# Altium footprint library MPBoard.PcbLib: 123 footprints (part 4 of 8)
Each footprint in its own frame and in the unit in brackets; x right, y up, seen from the top. Pads: shape width x height; smd on the part's side, far side on the other; paste and mask are expansions set on the pad; w line width, h text height; cw(c..) or ccw(c..) is an arc to the next point about the centre after c.
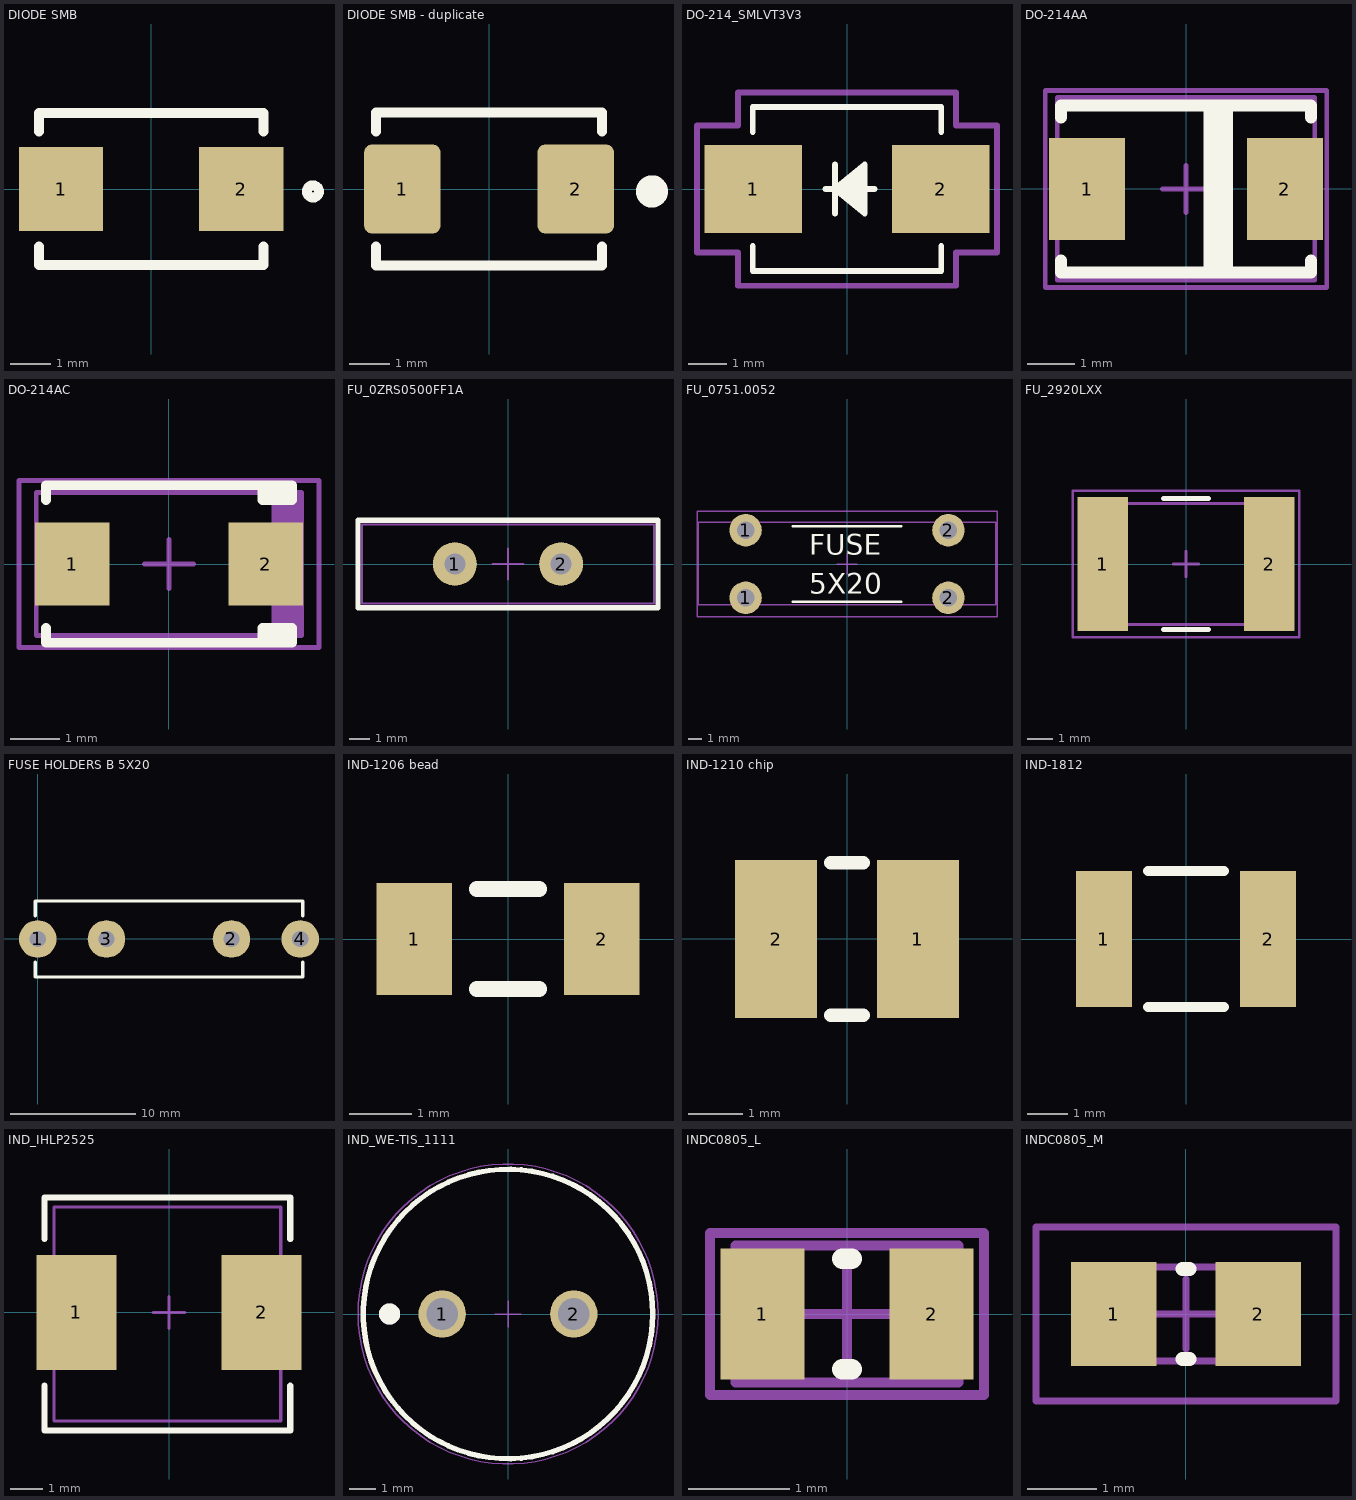
[diagram p3: the footprints below, top view; thin cyan lines are the x and y axes]

## DIODE SMB [mm]
pads (2):
  rect 2.1x2.1 smd: 1(-2.25,0) 2(2.25,0)
Top Overlay:
  circle w0.25: c4.04,-0.06 r0.15
  lines w0.25: -2.8,-1.43 -2.8,-1.9 2.8,-1.9 2.8,-1.43 ; -2.8,1.43 -2.8,1.9 2.8,1.9 2.8,1.43
3D body "diod_smb.stp": height 2.63, standoff -0.02, extent -2.794,-1.975 2.794,1.975

## DIODE SMB - duplicate [mm]
pads (2):
  rrect20% 1.9x2.2 smd: 1(-2.15,0) 2(2.15,0)
Top Overlay:
  circle w0.5: c4.04,-0.06 r0.15
  lines w0.25: -2.8,-1.43 -2.8,-1.9 2.8,-1.9 2.8,-1.43 ; -2.8,1.43 -2.8,1.9 2.8,1.9 2.8,1.43
3D body "diod_smb.stp": height 2.63, standoff -0.02, extent -2.794,-1.975 2.794,1.975

## DO-214_SMLVT3V3 [mil]
pads (2):
  rect 99x89 smd paste+0 mask+0: 1(-95,0) 2(95,0)
Top Overlay:
  lines w6: -95.5,-57.6 -95.5,-83 95.5,-83 95.5,-57.6 ; -95.5,57.6 -95.5,83 95.5,83 95.5,57.6 ; -22,0 28,0 ; -12,-25 -12,25 ; 18,-20 -12,0 ; 18,-15 -12,0 ; 18,-10 -12,0 ; 18,-5 -12,0 ; 18,5 -12,0 ; 18,10 -12,0 ; 18,15 -12,0 ; 18,20 -12,0 ; -12,0 18,-25 18,25 -12,0
Mechanical 13:
  lines w1: -22,0 28,0 ; -12,-25 -12,25 ; 18,-20 -12,0 ; 18,-15 -12,0 ; 18,-10 -12,0 ; 18,-5 -12,0 ; 18,5 -12,0 ; 18,10 -12,0 ; 18,15 -12,0 ; 18,20 -12,0 ; -12,0 18,-25 18,25 -12,0 ; -110,-43.5 -90.5,-43.5 -90.5,43.5 -110,43.5 -110,-43.5 ; 90.5,-43.5 110,-43.5 110,43.5 90.5,43.5 90.5,-43.5
Mechanical 15:
  lines w6: -152,-64.5 -110.5,-64.5 -110.5,-98 110.5,-98 110.5,-64.5 152,-64.5 152,64.5 110.5,64.5 110.5,98 -110.5,98 -110.5,64.5 -152,64.5 -152,-64.5
3D body "SMB_STM.step": height 104.09, standoff 0, extent -110,-79.98 110,76

## DO-214AA [mm] "Molded Diode, 2-Leads, Body 4.31x3.62mm, IPC Medium Density"
height 2.44
pads (2):
  rect 1.62x2.18 smd: 1(-2.11,0) 2(2.11,0)
Top Overlay:
  rectangle: 0.375,-1.778 1,1.778
  lines w0.254: -2.667,-1.524 -2.667,-1.778 2.667,-1.778 2.667,-1.524 ; -2.667,1.524 -2.667,1.778 2.667,1.778 2.667,1.524
Top Component Outline:
  lines w0.1: -2.75,-1.95 -2.75,1.95 2.75,1.95 2.75,-1.95 -2.75,-1.95
Top Courtyard:
  lines w0.1: -0.5,0 0.5,0 ; 0,-0.5 0,0.5 ; -3,-2.1 3,-2.1 3,2.1 -3,2.1 -3,-2.1
3D body "DO-214AA (SMB).step": height 2.45, standoff 0.03, extent -2.75,-1.95 2.75,1.95

## DO-214AC [mm] "Molded Diode, 2-Leads, Body 4,60x2,79mm, IPC Medium Density"
height 2.29
pads (2):
  rect 1.52x1.68 smd: 1(-1.965,0) 2(1.965,0)
Top Overlay:
  lines w0.2: -2.5,-1.3 -2.5,-1.6 2.5,-1.6 2.5,-1.3 1.9,-1.3 1.9,-1.6 2.3,-1.6 2.3,-1.3 ; -2.5,1.3 -2.5,1.6 2.5,1.6 2.5,1.3 2.3,1.3 ; 2,1.6 1.9,1.5 1.9,1.3 2.3,1.3 ; 2.1,-1.6 2.1,-1.3 ; 2.1,1.3 2.1,1.6 ; 2.3,1.6 2.3,1.3
Top Component Outline:
  rectangle: 2.081,-1.45 2.7,1.45
  lines w0.1: -2.7,-1.45 2.7,-1.45 2.7,1.45 -2.7,1.45 -2.7,-1.45
Top Courtyard:
  lines w0.1: -0.5,0 0.5,0 ; 0,-0.5 0,0.5 ; -3.05,-1.7 3.05,-1.7 3.05,1.7 -3.05,1.7 -3.05,-1.7
3D body "DO-214AC (SMA).step": height 2.6, standoff 0.03, extent -2.75,-1.4 2.75,1.4

## FU_0ZRS0500FF1A [mm]
pads (2):
  round 2.1 hole 1: 1(-2.55,0) 2(2.55,0)
Top Overlay:
  lines w0.254: -7.2,-2.1 7.2,-2.1 7.2,2.1 -7.2,2.1 -7.2,-2.1
Top Component Outline:
  lines w0.1: -7,-1.9 -7,1.9 7,1.9 7,-1.9 -7,-1.9
Top Courtyard:
  lines w0.1: -0.75,0 0.75,0 ; 0,-0.75 0,0.75 ; -7,-1.9 7,-1.9 7,1.9 -7,1.9 -7,-1.9
3D body: height 1, standoff -1, extent -2.952,-0.404 -2.145,0.404
3D body: height 1, standoff -1, extent 2.145,-0.404 2.952,0.404
3D body "0ZRS0500FF1A.STEP": height 26.1, standoff -5.6, extent -7,-1.9 7,1.9

## FU_0751.0052 [mm]
pads (4):
  round 2.4 hole 1.3: 1(-7.5,-2.5) 1(-7.5,2.5) 2(7.5,-2.5) 2(7.5,2.5)
Top Overlay:
  lines w0.2: -4,-2.8 4,-2.8 ; -4,2.8 4,2.8
  text "FUSE" at -2.8,0.7 h1.52
  text "5X20" at -2.8,-2.2 h1.52
Top Component Outline:
  lines w0.1: -11,-3 11,-3 11,3.1 -11,3.1 -11,-3
Top Courtyard:
  lines w0.1: -0.75,0 0.75,0 ; 0,-0.75 0,0.75 ; -11.1,-3.9 -11.1,3.9 11.1,3.9 11.1,-3.9 -11.1,-3.9
3D body "0751.0042_1.STEP": height 12.1, standoff -4.9, extent -11,-3 -4.6,3
3D body "0751.0042_1.STEP": height 12.1, standoff -4.9, extent 4.6,-2.9 11,3.1
3D body "34-1525.stp": height 9.5, standoff 4.3, extent -10,-2.6 10,2.6

## FU_2920LXX [mm] "Chip PTC Resettable Fuses"
height 0.85
pads (2):
  rect 2x5.3 smd: 1(-3.3,0) 2(3.3,0)
Top Overlay:
  lines w0.2: -0.9,-2.6 0.9,-2.6 ; -0.9,2.6 0.9,2.6
Top Component Outline:
  lines w0.1: -3.825,-2.4 3.825,-2.4 3.825,2.4 -3.825,2.4 -3.825,-2.4
Top Courtyard:
  lines w0.1: -0.5,0 0.5,0 ; 0,-0.5 0,0.5 ; -4.5,-2.9 4.5,-2.9 4.5,2.9 -4.5,2.9 -4.5,-2.9
3D body: height 1, standoff 0, extent -2,-2.4 2,2.4
3D body: height 1, standoff 0, extent -3.825,-2.4 -2,2.4
3D body: height 1, standoff 0, extent 2,-2.4 3.825,2.4

## FUSE HOLDERS B 5X20 [mm]
pads (4):
  round 3 hole 1.3: 1(0,0) 2(15.5,0) 3(5.5,0) 4(21,0)
Top Overlay:
  lines w0.25: -0.2,-1.85 -0.2,-3.05 21.2,-3.05 21.2,-1.85 ; -0.2,1.85 -0.2,3.05 21.2,3.05 21.2,1.85
3D body "fuse_holders_b_5x20.stp": height 9.25, standoff -2, extent -0.2,-2.95 21.2,2.95

## IND-1206 bead [mm] "Bead"
pads (2):
  rect 1.2x1.8 smd: 1(-1.5,0) 2(1.5,0)
Top Overlay:
  lines w0.25: -0.5,-0.8 0.5,-0.8 ; -0.5,0.8 0.5,0.8
3D body "IND_BLM31KN_MUR.step": height 1.8, standoff 0, extent -1.702,-0.902 1.702,0.902

## IND-1210 chip [mm]
pads (2):
  rect 1.5x2.9 smd: 1(1.3,0) 2(-1.3,0)
Top Overlay:
  lines w0.25: -0.3,-1.4 0.3,-1.4 ; -0.3,1.4 0.3,1.4
3D body "inductor_1210_chip.stp": height 1.35, standoff 0, extent -1.6,-1.25 1.6,1.25

## IND-1812 [mm]
height 1.3
pads (2):
  rect 1.4x3.4 smd: 1(-2.05,0) 2(2.05,0)
Top Overlay:
  lines w0.25: -0.95,-1.7 0.95,-1.7 ; -0.95,1.7 0.95,1.7
3D body "inductor_B82432T.STEP": height 3.24, standoff -0.09, extent -2.25,-1.6 2.25,1.6

## IND_IHLP2525 [mm] "SMD inductor, 6.47x6.47 mm"
height 3
pads (2):
  rect 2.5x3.6 smd: 1(-2.9,0) 2(2.9,0)
Top Overlay:
  lines w0.2: -3.9,-2.3 -3.9,-3.7 3.8,-3.7 3.8,-2.3 ; -3.9,2.3 -3.9,3.6 3.8,3.6 3.8,2.3
Top Component Outline:
  lines w0.1: -3.6,-3.4 -3.6,3.3 3.5,3.3 3.5,-3.4 -3.6,-3.4
Top Courtyard:
  lines w0.1: -0.5,0 0.5,0 ; 0,-0.5 0,0.5 ; -3.6,-3.4 -3.6,3.3 3.5,3.3 3.5,-3.4 -3.6,-3.4
3D body "52621.stp": height 2.89, standoff 0, extent -3.563,-3.345 3.513,3.325

## IND_WE-TIS_1111 [mm] "THT Shielded Radial Leaded Wire Wound Inductor, body diameter 11mm"
height 11.5
pads (2):
  round 1.8 hole 1.2: 1(-2.5,0) 2(2.5,0)
Top Overlay:
  circle w0.2: c0,0 r5.5
  circle w0.4: c-4.5,0 r0.2
Top Component Outline:
  circle w0.1: c0,0 r5.5
  circle w0.4: c-4.5,0 r0.2
Top Courtyard:
  circle w0.05: c0,0 r5.7
  lines w0.05: -0.5,0 0.5,0 ; 0,-0.5 0,0.5
3D body "7447471xxx.stp": height 10.52, standoff -3.48, extent -7.496,-7.496 7.495,7.495

## INDC0805_L [mm] "Chip Inductor, 2-Leads, Body 2,00x1,25mm, IPC High Density"
height 0.7
pads (2):
  rect 0.83x1.29 smd: 1(-0.835,0) 2(0.835,0)
Top Overlay:
  lines w0.2: -0.05,-0.545 0.05,-0.545 ; -0.05,0.545 0.05,0.545
Top Component Outline:
  lines w0.1: -1.1,-0.675 -1.1,0.675 1.1,0.675 1.1,-0.675 -1.1,-0.675
Top Courtyard:
  lines w0.1: -0.5,0 0.5,0 ; 0,-0.5 0,0.5 ; -1.35,-0.8 -1.35,0.8 1.35,0.8 1.35,-0.8 -1.35,-0.8
3D body: height 0.7, standoff 0, extent -0.7,-0.675 0.7,0.675
3D body: height 0.7, standoff 0, extent -1.1,-0.675 -0.7,0.675
3D body: height 0.7, standoff 0, extent 0.7,-0.675 1.1,0.675

## INDC0805_M [mm] "Chip Inductor, 2-Leads, Body 2,00x1,25mm, IPC Low Density"
height 0.7
pads (2):
  rect 1.23x1.49 smd: 1(-1.035,0) 2(1.035,0)
Top Overlay:
  lines w0.2: -0.05,-0.645 0.05,-0.645 ; -0.05,0.645 0.05,0.645
Top Component Outline:
  lines w0.1: -1.1,-0.675 -1.1,0.675 1.1,0.675 1.1,-0.675 -1.1,-0.675
Top Courtyard:
  lines w0.1: -0.5,0 0.5,0 ; 0,-0.5 0,0.5 ; -2.15,-1.25 -2.15,1.25 2.15,1.25 2.15,-1.25 -2.15,-1.25
3D body: height 0.7, standoff 0, extent -0.7,-0.675 0.7,0.675
3D body: height 0.7, standoff 0, extent -1.1,-0.675 -0.7,0.675
3D body: height 0.7, standoff 0, extent 0.7,-0.675 1.1,0.675